# Altium footprint library ZZQ_PCBLib.PcbLib: 84 footprints (part 6 of 6)
Each footprint in its own frame and in the unit in brackets; x right, y up, seen from the top. Pads: shape width x height; smd on the part's side, far side on the other; paste and mask are expansions set on the pad; w line width, h text height; cw(c..) or ccw(c..) is an arc to the next point about the centre after c.
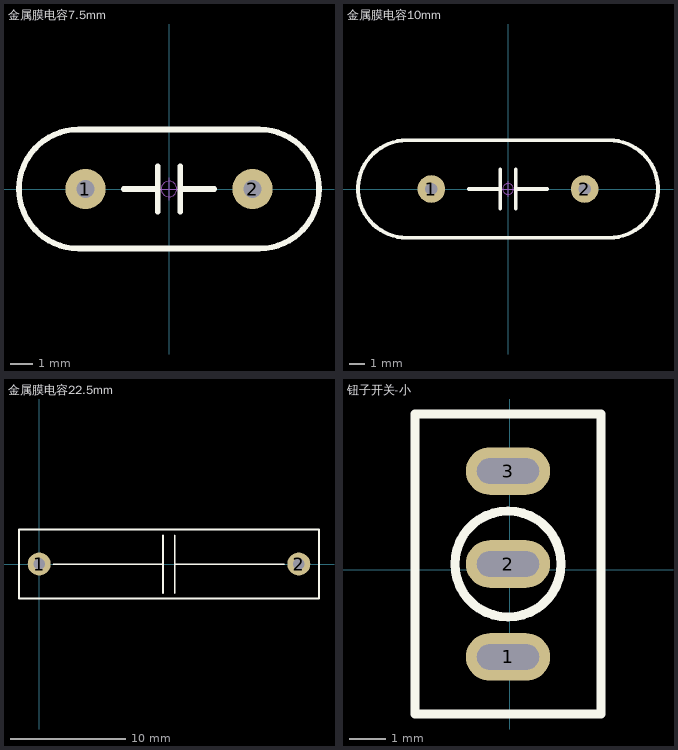
[diagram p5: the footprints below, top view; thin cyan lines are the x and y axes]

## 金属膜电容7.5mm [mm] "脚距7.5mm，直径12mm，厚5mm                 淘宝ID:黄晶宝石"
pads (2):
  round 1.8 hole 0.8: 1(-3.75,0) 2(3.75,0)
Top Overlay:
  lines w0.254: -2.032,0 -0.508,0 ; -0.508,-1.016 -0.508,1.016 ; 0.508,-1.016 0.508,1.016 ; 0.508,0 2.032,0 ; -4.064,-2.667 cw(c-4.064,0) -4.064,2.667 4.064,2.667 cw(c4.064,0) 4.064,-2.667 -4.064,-2.667
Mechanical 15:
  circle w0.05: c0,0 r0.35
  lines w0.05: -0.5,0 0.5,0 ; 0,-0.5 0,0.5
3D body "CY_7.5x12x5-2.STEP": height 12.35, standoff -3.15, extent -6,-2.5 6,2.5

## 金属膜电容10mm [mm] "脚距10mm，直径18mm，厚6mm"
pads (2):
  round 1.8 hole 0.8: 1(-5,0) 2(5,0)
Top Overlay:
  lines w0.254: -2.54,0 -0.604,0 ; -0.508,-1.27 -0.508,1.27 ; 0.508,-1.27 0.508,1.27 ; 0.508,0 2.54,0 ; -6.604,-3.175 cw(c-6.604,0) -6.604,3.175 6.604,3.175 cw(c6.604,0) 6.604,-3.175 -6.604,-3.175
Mechanical 15:
  circle w0.05: c0,0 r0.35
  lines w0.05: -0.5,0 0.5,0 ; 0,-0.5 0,0.5
3D body "CY_10x18x6.STEP": height 18.91, standoff -2.59, extent -9,-3 9,3

## 金属膜电容22.5mm [mm] "联系你的卖家 免费查找封装"
pads (2):
  round 2 hole 1: 1(0,0) 2(22.5,0)
Top Overlay:
  lines w0.15: 1.237,-0.023 10.737,-0.023 ; 10.737,-2.523 10.737,2.477 ; 11.737,-2.523 11.737,2.477 ; 11.737,-0.023 21.237,-0.023 ; -1.75,-3 24.25,-3 24.25,3 -1.75,3 -1.75,-3
3D body "MKT(22_5_26x15x6).step": height 16, standoff -2, extent -1.75,-3.005 24.25,3.005

## 钮子开关-小 [mm]
height 4
pads (3):
  oval 2.3x1.3 hole 0.7 slot 1.7 at 0 deg: 1(-0.048,-2.377) 2(-0.048,0.163) 3(-0.048,2.703)
Top Overlay:
  circle w0.254: c-0.048,0.163 r1.448
  lines w0.254: -2.588,-3.937 2.492,-3.937 2.492,4.263 -2.588,4.263 -2.588,-3.937